# Altium footprint library PCBLib Matias.PcbLib: 46 footprints (part 1 of 3)
Each footprint in its own frame and in the unit in brackets; x right, y up, seen from the top. Pads: shape width x height; smd on the part's side, far side on the other; paste and mask are expansions set on the pad; w line width, h text height; cw(c..) or ccw(c..) is an arc to the next point about the centre after c.
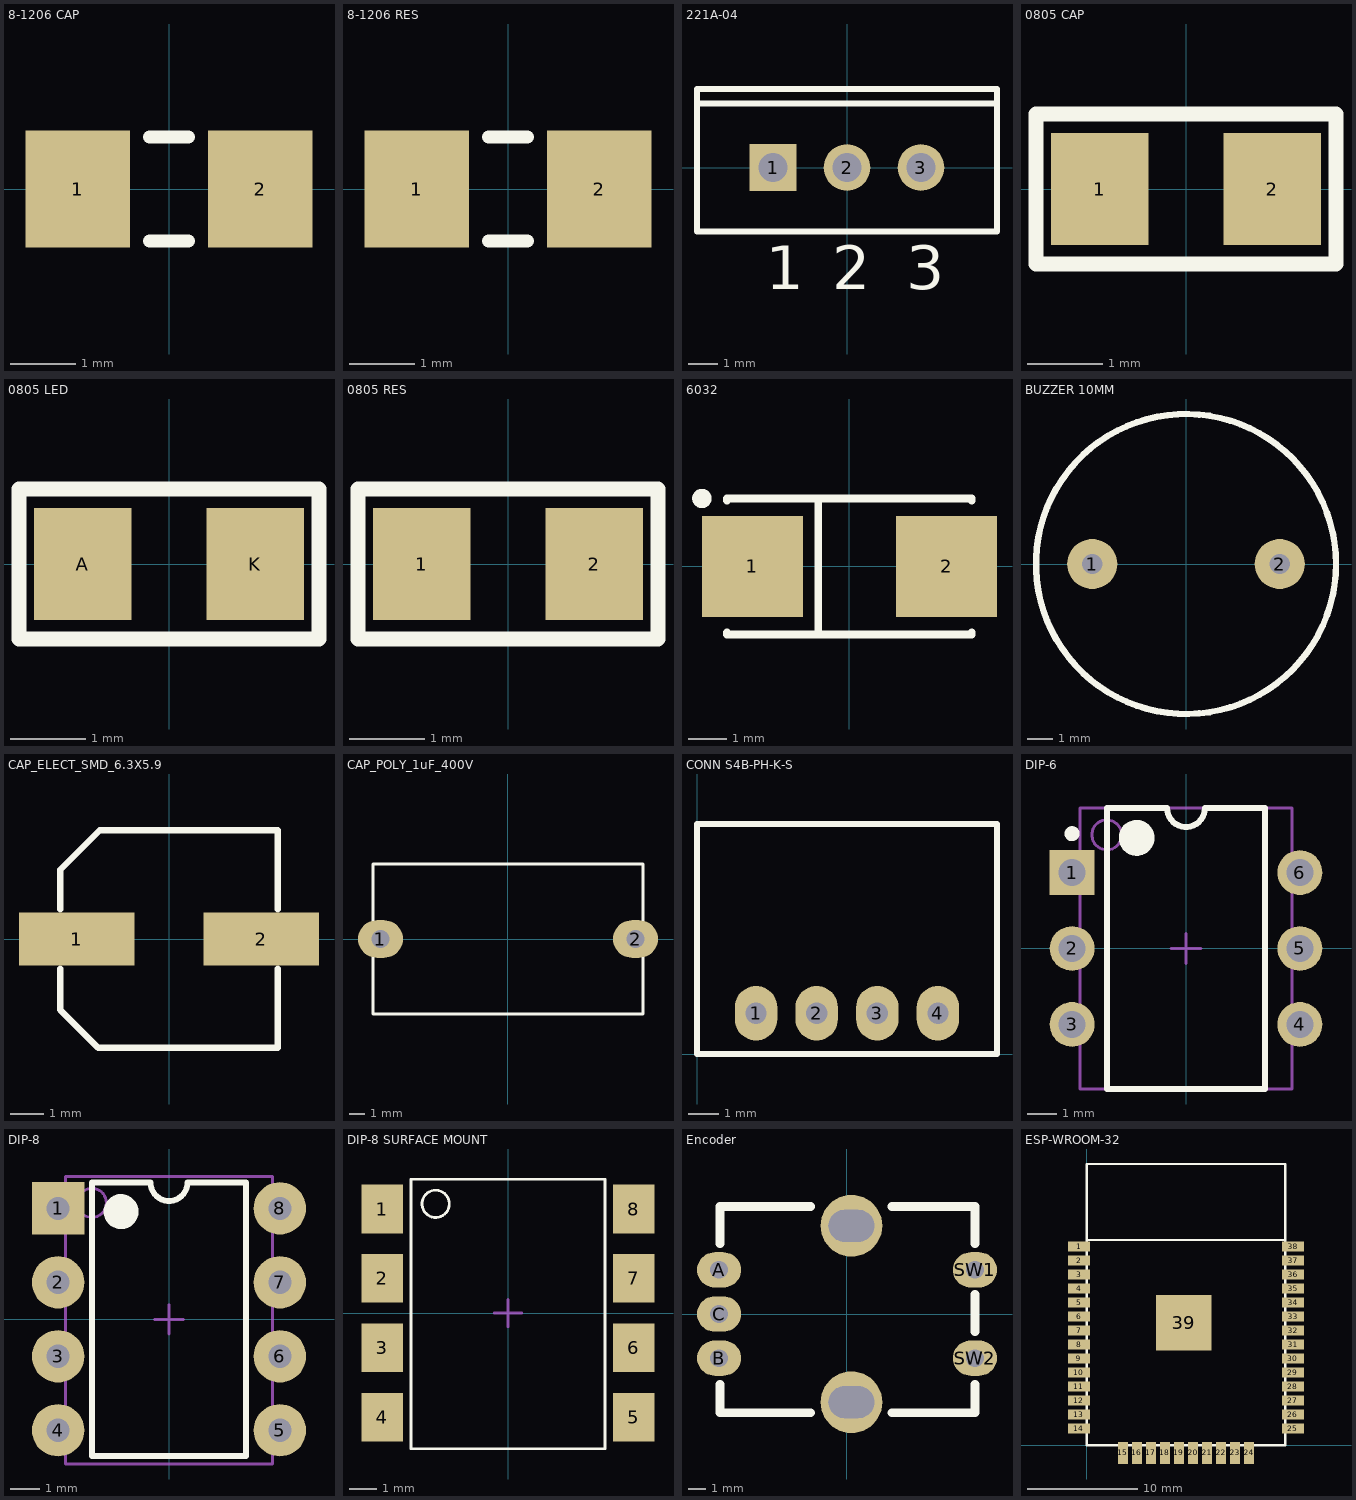
[diagram p0: the footprints below, top view; thin cyan lines are the x and y axes]

## 8-1206 CAP [mm]
pads (2):
  rect 1.6x1.8 smd: 1(-1.4,0) 2(1.4,0)
Top Overlay:
  lines w0.2: -0.3,-0.8 0.3,-0.8 ; -0.3,0.8 0.3,0.8
3D body "User Library-SMD CAPACITOR1206.STEP": height 0.77, standoff -0.01, extent -1.6,-0.85 1.6,0.75

## 8-1206 RES [mm]
pads (2):
  rect 1.6x1.8 smd: 1(-1.4,0) 2(1.4,0)
Top Overlay:
  lines w0.2: -0.3,-0.8 0.3,-0.8 ; -0.3,0.8 0.3,0.8
3D body "User Library-R SMD 1206.STEP": height 0.53, standoff -0.02, extent -1.6,-0.75 1.6,0.85

## 221A-04 [mm] "TO, Thru-Hole, Vertical, Heatsink Mounted; 3 In-Line Leads; Pitch 2.54 mm"
height 19.7
pads (3):
  rect 1.6x1.6 hole 1: 1(-2.54,0)
  round 1.6 hole 1: 2(0,0) 3(2.54,0)
Top Overlay:
  lines w0.2: -5.15,2.2 5.15,2.2 ; -5.15,-2.2 5.15,-2.2 5.15,2.7 -5.15,2.7 -5.15,-2.2
  text "1" at -2.79,-4.175 h1.5
  text "2" at -0.5,-4.175 h1.5
  text "3" at 2.04,-4.175 h1.5
3D body "User Library-TO220AB.step": height 19.83, standoff -9.5, extent -5.606,-1.4 5.607,3.29

## 0805 CAP [mm]
pads (2):
  rect 1.3x1.5 smd: 1(-1.15,0) 2(1.15,0)
Top Overlay:
  lines w0.2: -2,-1 -2,1 2,1 2,-1 -2,-1
3D body "c0805c101k5gactu.stp": height 0.88, standoff 0, extent -1.1,-0.75 1.1,0.7

## 0805 LED [mm]
pads (2):
  rect 1.3x1.5 smd: A(-1.15,0) K(1.15,0)
Top Overlay:
  lines w0.2: -2,-1 -2,1 2,1 2,-1 -2,-1
3D body "ALSRobot-LED0805(B).step": height 1.1, standoff 0, extent -1.01,-0.625 1.01,0.625

## 0805 RES [mm]
pads (2):
  rect 1.3x1.5 smd: 1(-1.15,0) 2(1.15,0)
Top Overlay:
  lines w0.2: -2,-1 2,-1 2,1 -2,1 -2,-1
3D body "User Library-R SMD 0805.STEP": height 0.42, standoff -0.03, extent -1.026,-0.625 0.974,0.625

## 6032 [mm]
pads (2):
  rect 2.6x2.6 smd: 1(-2.5,0) 2(2.5,0)
Top Overlay:
  circle w0.25: c-3.8,1.75 r0.125
  lines w0.2: -3.15,-1.7 -3.15,-1.75 3.15,-1.75 3.15,-1.7 ; -3.15,1.7 -3.15,1.75 3.15,1.75 3.15,1.7 ; -0.8,-1.75 -0.8,1.75
3D body "User Library-CAP_TANT_6032-28_y.STEP": height 2.8, standoff 0, extent -3.1,-1.65 3.2,1.85

## BUZZER 10MM [mm]
pads (2):
  round 2 hole 0.8: 1(-3.75,0) 2(3.75,0)
Top Overlay:
  circle w0.254: c0,0 r6
3D body "User Library-WST-1203UX.step": height 9.65, standoff -4.5, extent -9.454,-6 6,6

## CAP_ELECT_SMD_6.3X5.9 [mm]
pads (2):
  rect 3.5x1.6 smd: 1(-2.8,0) 2(2.8,0)
Top Overlay:
  lines w0.2: -3.3,-0.9 -3.3,-2.15 -2.15,-3.3 3.3,-3.3 3.3,-0.9 ; -3.3,0.9 -3.3,2.1 -2.1,3.3 3.3,3.3 3.3,0.9
3D body "User Library-CAP SMD SVP 6_3x5_9.STEP": height 5.9, standoff 0, extent -3.65,-3.3 3.65,3.3

## CAP_POLY_1uF_400V [mm]
pads (2):
  oval 3x2.5 hole 1.2: 1(-8.5,0) 2(8.5,0)
Top Overlay:
  lines w0.2: -9,-5 -9,5 9,5 9,-5 -9,-5
3D body "Poly Cap 1uF.stp": height 16, standoff -5, extent -9,-5 9,5

## CONN S4B-PH-K-S [mm]
pads (4):
  oval 1.4x1.8 hole 0.7: 1(1.95,1.35) 2(3.95,1.35) 3(5.95,1.35) 4(7.95,1.35)
Top Overlay:
  lines w0.2: 0,0 9.9,0 9.9,7.6 0,7.6 0,0
3D body "User Library-B4B-PH-SM4(LF)(SN).step": height 5, standoff -2, extent -1.05,1.1 10.9,7.7

## DIP-6 [mm]
pads (6):
  rect 1.5x1.5 hole 0.9: 1(-3.81,2.54)
  round 1.5 hole 0.9: 2(-3.81,0) 3(-3.81,-2.54) 4(3.81,-2.54) 5(3.81,0) 6(3.81,2.54)
Top Overlay:
  circle w0.25: c-3.81,3.84 r0.125
  circle w0.6: c-1.65,3.7 r0.3
  lines w0.2: -2.65,-4.7 -2.65,4.7 -0.635,4.7 ccw(c0,4.7) 0.635,4.7 2.65,4.7 2.65,-4.7 -2.65,-4.7
Mechanical 13:
  circle w0.1: c-2.65,3.8 r0.5
  lines w0.1: -3.55,-4.7 -3.55,4.7 3.55,4.7 3.55,-4.7 -3.55,-4.7
Mechanical 15:
  lines w0.1: -0.5,0 0.5,0 ; 0,-0.5 0,0.5
3D body "DIP-6.step": height 4.31, standoff -3.28, extent -4.05,-3.98 3.95,4.1

## DIP-8 [mm]
pads (8):
  rect 1.8x1.8 hole 0.8: 1(-3.81,3.81)
  round 1.8 hole 0.8: 2(-3.81,1.27) 3(-3.81,-1.27) 4(-3.81,-3.81) 5(3.81,-3.81) 6(3.81,-1.27) 7(3.81,1.27) 8(3.81,3.81)
Top Overlay:
  circle w0.6: c-1.65,3.7 r0.3
  lines w0.2: -2.65,-4.7 2.65,-4.7 2.65,4.7 0.635,4.7 cw(c0,4.7) -0.635,4.7 -2.65,4.7 -2.65,-4.7
Mechanical 13:
  circle w0.1: c-2.65,4 r0.5
  lines w0.1: -3.55,-4.97 -3.55,4.9 3.55,4.9 3.55,-4.97 -3.55,-4.97
Mechanical 15:
  lines w0.1: -0.5,0 0.5,0 ; 0,-0.5 0,0.5
3D body "CircuitWorks-DIP8.step": height 4.19, standoff -2.67, extent -3.837,-5.7 4.037,5.73

## DIP-8 SURFACE MOUNT [mm]
pads (8):
  rect 1.52x1.78 all layers, no hole: 1(-4.605,3.81) 2(-4.605,1.27) 3(-4.605,-1.27) 4(-4.605,-3.81) 5(4.605,-3.81) 6(4.605,-1.27) 7(4.605,1.27) 8(4.605,3.81)
Top Overlay:
  circle w0.1: c-2.65,4 r0.5
  lines w0.1: -3.55,-4.97 -3.55,4.9 3.55,4.9 3.55,-4.97 -3.55,-4.97
Mechanical 15:
  lines w0.1: -0.5,0 0.5,0 ; 0,-0.5 0,0.5
3D body "User Library-8-pin-DIP_GW_HCPL-4200-300E.step": height 4.3, standoff -0.03, extent -5,-4.95 4.9,4.95

## Encoder [mm]
pads (7):
  oval 2.5x2 hole 1: A(-7.25,2.5) B(-7.25,-2.5) C(-7.25,0) SW1(7.25,2.5) SW2(7.25,-2.5)
  round 3.5 hole 1.8 slot 2.6 at 0 deg: ""(0.25,-5) ""(0.25,5)
Top Overlay:
  lines w0.5: -7.2,-4 -7.2,-5.6 -2.05,-5.6 ; -7.2,4 -7.2,6.1 -2.05,6.1 ; 2.55,-5.6 7.25,-5.6 7.25,-4 ; 2.55,6.1 7.25,6.1 7.25,4 ; 7.25,-1 7.25,1.1
3D body "Encoder.stp": height 21.6, standoff -3.6, extent -7.5,-7 7.4,7

## ESP-WROOM-32 [mm]
pads (39):
  rect 2x0.9 smd: 1(-0.69,18.01) 2(-0.69,16.74) 3(-0.69,15.47) 4(-0.69,14.2) 5(-0.69,12.93) 6(-0.69,11.66) 7(-0.69,10.39) 8(-0.69,9.12) 9(-0.7,7.85) 10(-0.7,6.58) 11(-0.7,5.31) 12(-0.7,4.04) 13(-0.7,2.77) 14(-0.7,1.5) 25(18.7,1.5) 26(18.7,2.77) 27(18.7,4.04) 28(18.7,5.31) 29(18.7,6.58) 30(18.7,7.85) 31(18.71,9.12) 32(18.71,10.39) 33(18.71,11.66) 34(18.71,12.93) 35(18.71,14.2) 36(18.71,15.47) 37(18.71,16.74) 38(18.71,18.01)
  rect 0.9x2 smd: 15(3.29,-0.69) 16(4.56,-0.69) 17(5.83,-0.7) 18(7.1,-0.7) 19(8.37,-0.7) 20(9.64,-0.7) 21(10.91,-0.7) 22(12.18,-0.7) 23(13.45,-0.7) 24(14.72,-0.7)
  rect 5x5 smd: 39(8.8,11.1)
Top Overlay:
  lines w0.2: 0,18.6 18,18.6 ; 0,0 0,25.5 18,25.5 18,0 0,0
3D body "User Library-ESP321.step": height 2.91, standoff -0.01, extent 0.1,-0.15 18.1,25.35